# Altium footprint library NDLib.PCBLIB: 499 footprints (part 25 of 32)
Each footprint in its own frame and in the unit in brackets; x right, y up, seen from the top. Pads: shape width x height; smd on the part's side, far side on the other; paste and mask are expansions set on the pad; w line width, h text height; cw(c..) or ccw(c..) is an arc to the next point about the centre after c.
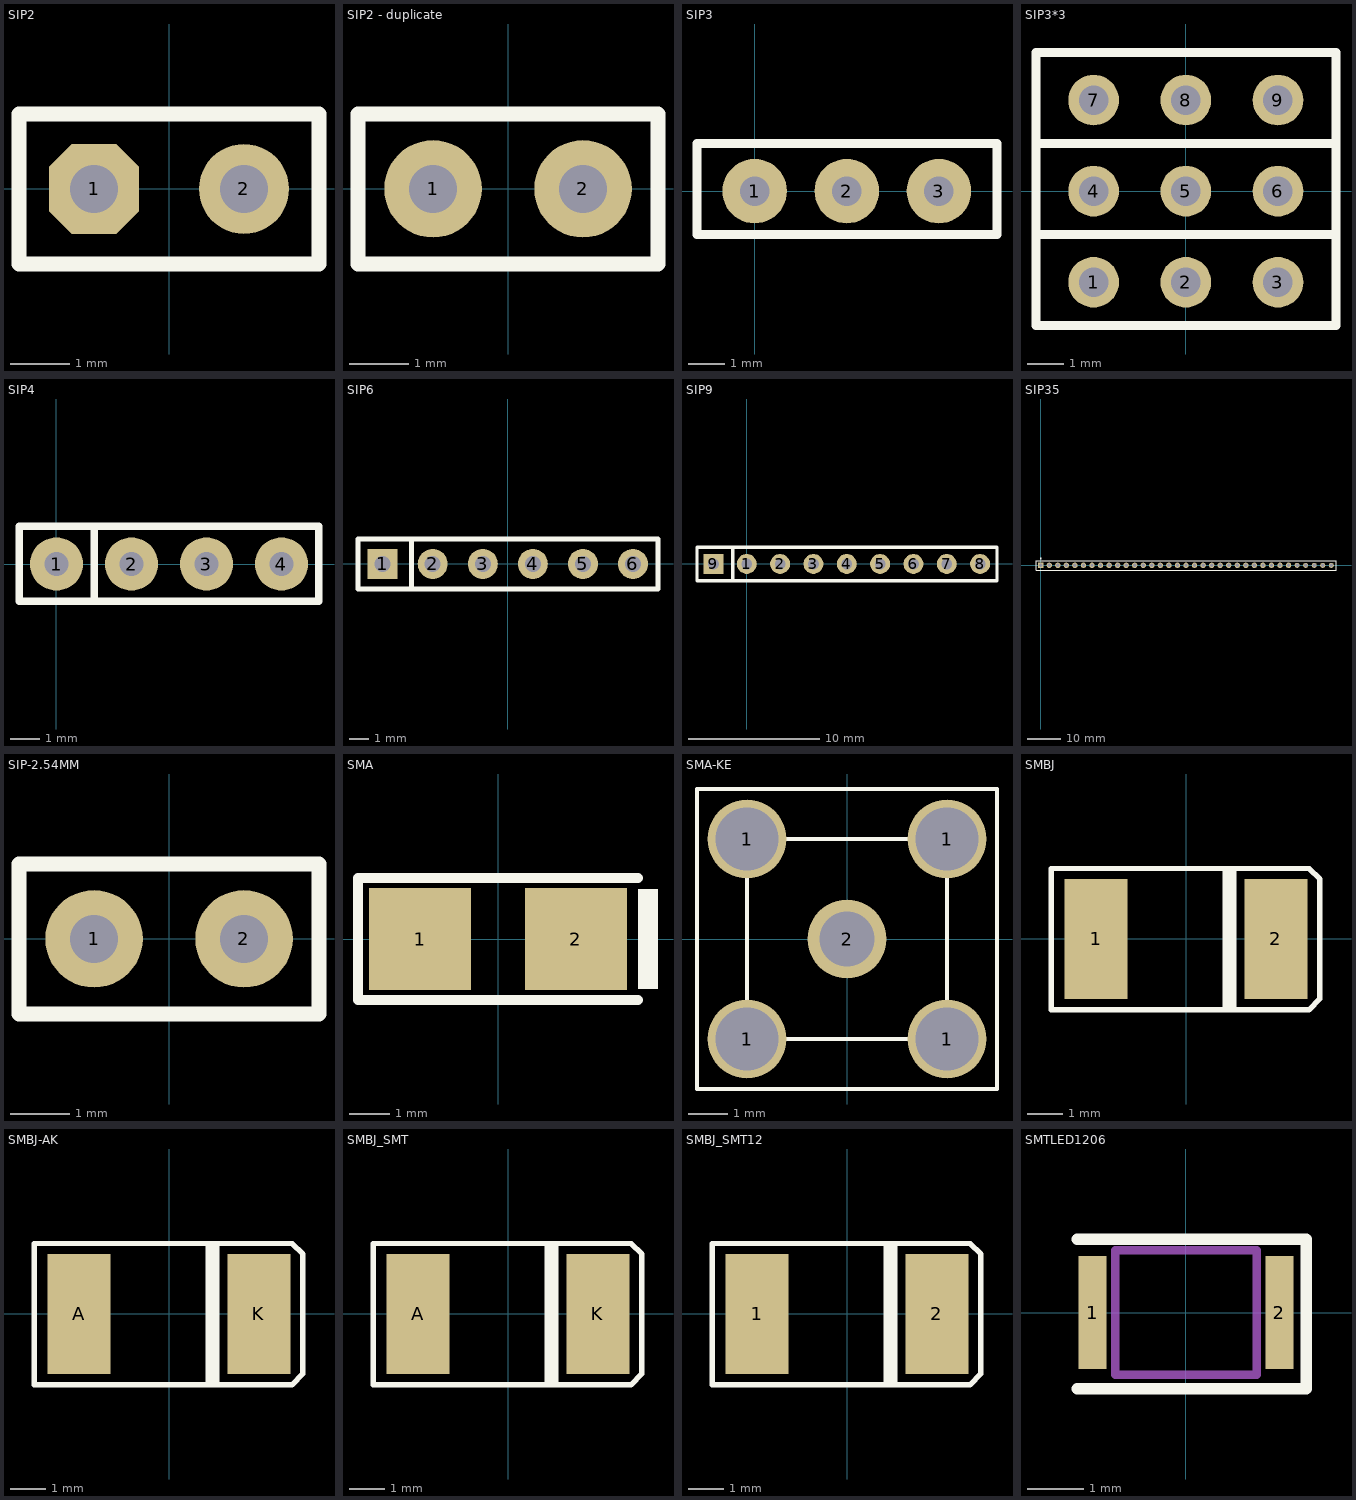
[diagram p24: the footprints below, top view; thin cyan lines are the x and y axes]

## SIP2 [mil]
pads (2):
  oct 60x60 hole 32: 1(-50,0)
  round 60 hole 32: 2(50,0)
TopOverlay:
  lines w10: -100,-50.06 100,-50.06 100,49.94 -100,49.94 -100,-50.06

## SIP2 - duplicate [mil]
pads (2):
  round 65 hole 32: 1(-50,0) 2(50,0)
TopOverlay:
  lines w10: -100,-50.06 100,-50.06 100,49.94 -100,49.94 -100,-50.06

## SIP3 [mil]
pads (3):
  round 70 hole 32: 1(0,0) 2(100,0) 3(200,0)
TopOverlay:
  lines w10: -62.56,-47.06 263.01,-47.06 263.01,51.78 -62.56,51.78 -62.56,-47.06

## SIP3*3 [mil]
pads (9):
  round 55 hole 32: 1(-100,-98.83) 2(0,-98.83) 3(100,-98.83) 4(-100,0) 5(0,0) 6(100,0) 7(-100,98.83) 8(0,98.83) 9(100,98.83)
TopOverlay:
  lines w10: -162.56,-47.06 -162.56,51.78 ; -162.56,-47.06 163.01,-47.06 ; -162.56,-47.06 163.01,-47.06 ; -162.56,-47.06 -162.56,-145.89 163.01,-145.89 163.01,-47.06 ; -162.56,51.78 -162.56,150.61 163.01,150.61 163.01,51.78 ; -162.56,51.78 163.01,51.78 ; -162.56,51.78 163.01,51.78 ; 163.01,-47.06 163.01,51.78

## SIP4 [mm]
pads (4):
  round 1.8 hole 0.813: 1(0.005,0.005) 2(2.545,0.005) 3(5.085,0.005) 4(7.625,0.005)
TopOverlay:
  lines w0.254: 1.275,-1.265 1.275,1.275 ; -1.265,-1.265 -1.265,1.275 8.895,1.275 8.895,-1.265 -1.265,-1.265

## SIP6 [mil]
pads (6):
  rect 60x60 hole 32: 1(-250,0)
  round 60 hole 32: 2(-150,0) 3(-50,0) 4(50,0) 5(150,0) 6(250,0)
TopOverlay:
  lines w10: -192,-50 -192,50 ; -299.27,-50.38 -299.27,49.62 300,49.62 300,-50.38 -299.27,-50.38

## SIP9 [mil]
pads (9):
  round 60 hole 32: 1(0,0) 2(100,0) 3(200,0) 4(300,0) 5(400,0) 6(500,0) 7(600,0) 8(700,0)
  rect 60x60 hole 32: 9(-100,0)
TopOverlay:
  lines w10: -42,-50 -42,50 ; -149.28,-50.38 750.73,-50.38 750.73,49.62 -149.28,49.62 -149.28,-50.38

## SIP35 [mm] "LCD插座"
pads (35):
  rect 1.6x1.6 hole 0.99: 1(0,0)
  round 1.6 hole 0.99: 2(2.54,0) 3(5.08,0) 4(7.62,0) 5(10.16,0) 6(12.7,0) 7(15.24,0) 8(17.78,0) 9(20.32,0) 10(22.86,0) 11(25.4,0) 12(27.94,0) 13(30.48,0) 14(33.02,0) 15(35.56,0) 16(38.1,0) 17(40.64,0) 18(43.18,0) 19(45.72,0) 20(48.26,0) 21(50.8,0) 22(53.34,0) 23(55.88,0) 24(58.42,0) 25(60.96,0) 26(63.5,0) 27(66.04,0) 28(68.58,0) 29(71.12,0) 30(73.66,0)
  round 1.5 hole 1.1: 31(76.2,0) 32(78.74,0) 33(81.28,0) 34(83.82,0) 35(86.36,0)
TopOverlay:
  circle w0.25: c0,2.05 r0.125
  lines w0.2: -1.4,-1.4 -1.4,1.4 87.757,1.4 87.757,-1.4 -1.4,-1.4

## SIP-2.54MM [mil]
pads (2):
  round 65 hole 32: 1(-50,0) 2(50,0)
TopOverlay:
  lines w10: -100,-50.06 100,-50.06 100,49.94 -100,49.94 -100,-50.06

## SMA [mm]
pads (2):
  rect 2.54x2.54 smd: 1(-1.95,0) 2(1.95,0)
TopOverlay:
  rectangle: 3.5,-1.25 4,1.25
  lines w0.254: 3.5,-1.524 -3.5,-1.524 -3.5,1.524 3.5,1.524

## SMA-KE [mm]
pads (5):
  round 2 hole 1.6: 1(-2.54,-2.54) 1(-2.54,2.54) 1(2.54,-2.54) 1(2.54,2.54)
  round 2 hole 1.397: 2(0,0)
TopOverlay:
  lines w0.1: -3.81,-3.81 3.81,-3.81 3.81,3.81 -3.81,3.81 -3.81,-3.81 ; -2.54,-2.54 2.54,-2.54 2.54,0 2.54,2.54 -2.54,2.54 -2.54,0 -2.54,-2.54

## SMBJ [mm]
height 2
pads (2):
  rect 1.778x3.4 smd: 1(-2.54,0) 2(2.54,0)
TopOverlay:
  rectangle: 1.036,-2 1.424,2
  lines w0.154: -3.81,-2 3.472,-2 3.784,-1.688 3.784,1.69 3.481,1.992 -3.81,1.992 -3.81,-2
3D body: height 2.4, standoff 0, extent -2.3,-1.35 2.3,1.35

## SMBJ-AK [mm]
height 2
pads (2):
  rect 1.778x3.4 smd: A(-2.54,0) K(2.54,0)
TopOverlay:
  rectangle: 1.036,-2 1.424,2
  lines w0.154: -3.81,-2 3.472,-2 3.784,-1.688 3.784,1.69 3.481,1.992 -3.81,1.992 -3.81,-2
3D body: height 2.4, standoff 0, extent -2.3,-1.35 2.3,1.35

## SMBJ_SMT [mm]
height 2
pads (2):
  rect 1.778x3.4 smd: A(-2.54,0) K(2.54,0)
TopOverlay:
  rectangle: 1.036,-2 1.424,2
  lines w0.154: -3.81,-2 3.472,-2 3.784,-1.688 3.784,1.69 3.481,1.992 -3.81,1.992 -3.81,-2
3D body: height 2.4, standoff 0, extent -2.3,-1.35 2.3,1.35

## SMBJ_SMT12 [mm]
height 2
pads (2):
  rect 1.778x3.4 smd: 1(-2.54,0) 2(2.54,0)
TopOverlay:
  rectangle: 1.036,-2 1.424,2
  lines w0.154: -3.81,-2 -3.81,1.992 3.481,1.992 3.784,1.69 3.784,-1.688 3.472,-2 -3.81,-2

## SMTLED1206 [mm]
height 0.508
pads (2):
  rect 0.5x2 smd: 1(-1.654,0) 2(1.654,0)
TopOverlay:
  lines w0.2: -1.925,-1.35 2.125,-1.35 2.125,1.3 -1.925,1.3
Mechanical1:
  lines w0.152: -1.25,-1.1 1.25,-1.1 1.25,1.1 -1.25,1.1 -1.25,-1.1